# Altium footprint library FS_Footprints.PcbLib: 134 footprints (part 4 of 9)
Each footprint in its own frame and in the unit in brackets; x right, y up, seen from the top. Pads: shape width x height; smd on the part's side, far side on the other; paste and mask are expansions set on the pad; w line width, h text height; cw(c..) or ccw(c..) is an arc to the next point about the centre after c.
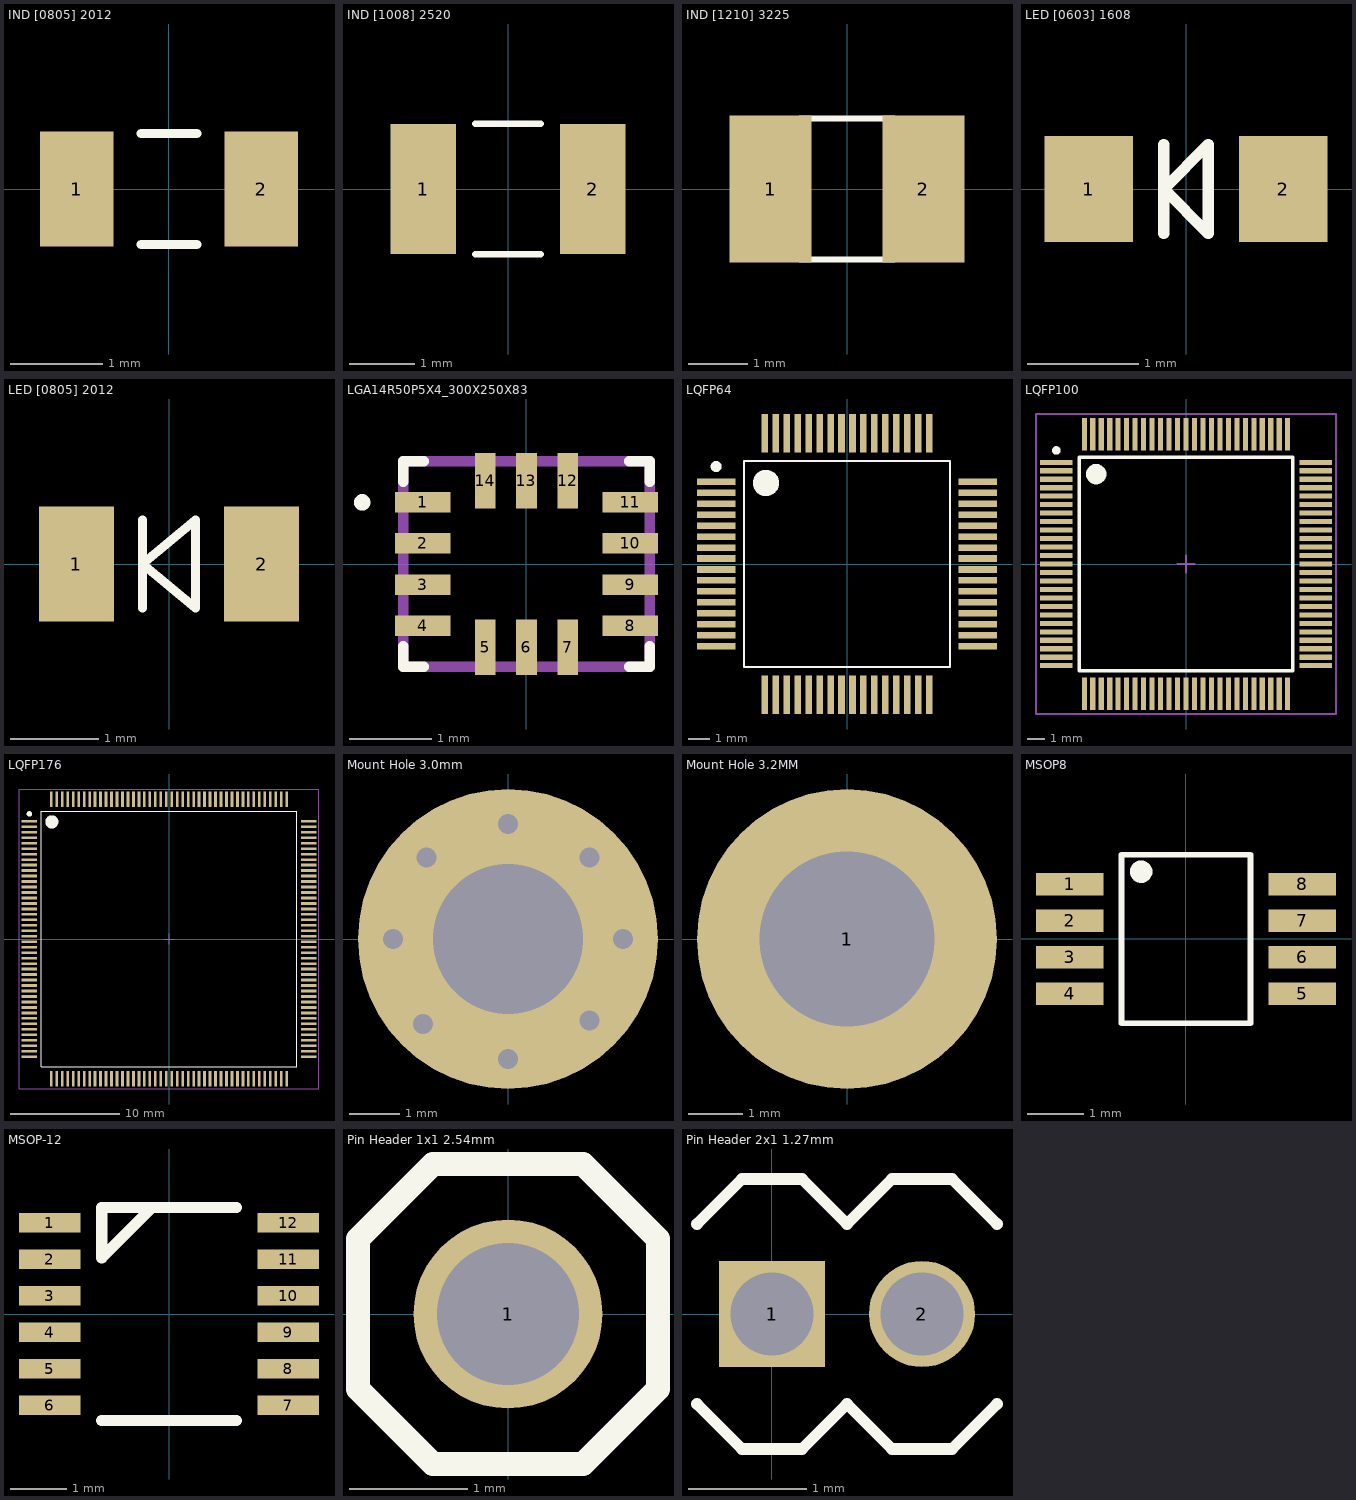
[diagram p3: the footprints below, top view; thin cyan lines are the x and y axes]

## IND [0805] 2012 [mm]
pads (2):
  rect 0.8x1.25 smd: 1(-1,0) 2(1,0)
Top Overlay:
  lines w0.1: -0.3,-0.6 0.3,-0.6 ; -0.3,0.6 0.3,0.6
3D body "Coilcraft-0805HS.step": height 1.44, standoff -0.01, extent -1.09,-0.759 1.09,0.759

## IND [1008] 2520 [mm]
pads (2):
  rect 1x2 smd: 1(-1.3,0) 2(1.3,0)
Top Overlay:
  lines w0.1: -0.5,-1 0.5,-1 ; -0.5,1 0.5,1
3D body "User Library-Chip Inductor 1008.step": height 2, standoff 0, extent -1.25,-1.1 1.25,1.1

## IND [1210] 3225 [mm]
pads (2):
  rect 1.4x2.5 smd: 1(-1.3,0) 2(1.3,0)
Top Overlay:
  lines w0.1: -0.8,-1.2 0.8,-1.2 ; -0.8,1.2 0.8,1.2
3D body "User Library-LQH32CN.step": height 2, standoff 0, extent -1.601,-1.36 1.601,1.361

## LED [0603] 1608 [mm] "Chip Diode, 2-Leads, Body 1.60x0.80mm, IPC Medium Density"
height 0.36
pads (2):
  rect 0.8x0.95 smd: 1(-0.875,0) 2(0.875,0)
Top Overlay:
  lines w0.1: -0.2,-0.4 -0.2,0.4 ; -0.2,0 0.2,-0.4 0.2,0.4 -0.2,0
3D body "User Library-LTST-C190EKT.STEP": height 0.9, standoff 0, extent -0.85,-0.45 0.85,0.45

## LED [0805] 2012 [mm] "0805 Led, 2-Leads, Body 2,00x1,25mm, IPC Medium Density"
height 0.6
pads (2):
  rect 0.85x1.3 smd: 1(-1.05,0) 2(1.05,0)
Top Overlay:
  lines w0.1: -0.3,-0.5 -0.3,0.5 ; -0.3,0 0.3,0.5 0.3,-0.5 -0.3,0
3D body "User Library-LED SMD0805.step": height 0.85, standoff 0.01, extent -1.041,-0.447 1.022,0.46
3D body: height 0.6, standoff 0, extent -1,-0.625 -0.6,0.625
3D body: height 0.6, standoff 0, extent 0.6,-0.625 1,0.625

## LGA14R50P5X4_300X250X83 [mm]
pads (14):
  rect 0.675x0.25 smd: 1(-1.262,0.75) 2(-1.262,0.25) 3(-1.262,-0.25) 4(-1.262,-0.75) 8(1.262,-0.75) 9(1.262,-0.25) 10(1.262,0.25) 11(1.262,0.75)
  rect 0.25x0.675 smd: 5(-0.5,-1.012) 6(0,-1.012) 7(0.5,-1.012) 12(0.5,1.012) 13(0,1.012) 14(-0.5,1.012)
Top Overlay:
  circle w0.1: c-2,0.75 r0.05
  lines w0.127: -1.5,-1 -1.5,-1.25 -1.25,-1.25 ; -1.5,1 -1.5,1.25 -1.25,1.25 ; 1.25,-1.25 1.5,-1.25 1.5,-1 ; 1.25,1.25 1.5,1.25 1.5,1
Top Paste:
  region: -1.6,0.625 -0.925,0.625 -0.925,0.875 -1.6,0.875
  region: -1.6,0.125 -0.925,0.125 -0.925,0.375 -1.6,0.375
  region: -1.6,-0.375 -0.925,-0.375 -0.925,-0.125 -1.6,-0.125
  region: -1.6,-0.875 -0.925,-0.875 -0.925,-0.625 -1.6,-0.625
  region: -0.625,-0.675 -0.625,-1.35 -0.375,-1.35 -0.375,-0.675
  region: -0.125,-0.675 -0.125,-1.35 0.125,-1.35 0.125,-0.675
  region: 0.375,-0.675 0.375,-1.35 0.625,-1.35 0.625,-0.675
  region: 0.925,-0.875 1.6,-0.875 1.6,-0.625 0.925,-0.625
  region: 0.925,-0.375 1.6,-0.375 1.6,-0.125 0.925,-0.125
  region: 0.925,0.125 1.6,0.125 1.6,0.375 0.925,0.375
  region: 0.625,0.675 0.625,1.35 0.375,1.35 0.375,0.675
  region: 0.125,0.675 0.125,1.35 -0.125,1.35 -0.125,0.675
  region: -0.375,0.675 -0.375,1.35 -0.625,1.35 -0.625,0.675
Mechanical 1:
  lines w0.127: -1.5,-1.25 1.5,-1.25 1.5,1.25 -1.5,1.25 -1.5,-1.25

## LQFP64 [mm]
height 1.6
pads (64):
  rect 1.75x0.3 smd: 1(-5.975,3.75) 2(-5.975,3.25) 3(-5.975,2.75) 4(-5.975,2.25) 5(-5.975,1.75) 6(-5.975,1.25) 7(-5.975,0.75) 8(-5.975,0.25) 9(-5.975,-0.25) 10(-5.975,-0.75) 11(-5.975,-1.25) 12(-5.975,-1.75) 13(-5.975,-2.25) 14(-5.975,-2.75) 15(-5.975,-3.25) 16(-5.975,-3.75) 33(5.975,-3.75) 34(5.975,-3.25) 35(5.975,-2.75) 36(5.975,-2.25) 37(5.975,-1.75) 38(5.975,-1.25) 39(5.975,-0.75) 40(5.975,-0.25) 41(5.975,0.25) 42(5.975,0.75) 43(5.975,1.25) 44(5.975,1.75) 45(5.975,2.25) 46(5.975,2.75) 47(5.975,3.25) 48(5.975,3.75)
  rect 0.3x1.75 smd: 17(-3.75,-5.975) 18(-3.25,-5.975) 19(-2.75,-5.975) 20(-2.25,-5.975) 21(-1.75,-5.975) 22(-1.25,-5.975) 23(-0.75,-5.975) 24(-0.25,-5.975) 25(0.25,-5.975) 26(0.75,-5.975) 27(1.25,-5.975) 28(1.75,-5.975) 29(2.25,-5.975) 30(2.75,-5.975) 31(3.25,-5.975) 32(3.75,-5.975) 49(3.75,5.975) 50(3.25,5.975) 51(2.75,5.975) 52(2.25,5.975) 53(1.75,5.975) 54(1.25,5.975) 55(0.75,5.975) 56(0.25,5.975) 57(-0.25,5.975) 58(-0.75,5.975) 59(-1.25,5.975) 60(-1.75,5.975) 61(-2.25,5.975) 62(-2.75,5.975) 63(-3.25,5.975) 64(-3.75,5.975)
Top Overlay:
  circle w0.6: c-3.7,3.7 r0.3
  circle w0.25: c-5.975,4.45 r0.125
  lines w0.1: -4.7,-4.7 4.7,-4.7 4.7,4.7 -4.7,4.7 -4.7,-4.7
3D body "User Library-lqpf64.step": height 1.5, standoff 0.02, extent -6,-6 6,6

## LQFP100 [mm] "LQFP, 100-Leads, Body 16,2x16,2mm (max), Pitch 0,50mm, IPC Medium Density"
height 1.6
pads (100):
  rect 1.9x0.3 smd: 1(-7.65,6) 2(-7.65,5.5) 3(-7.65,5) 4(-7.65,4.5) 5(-7.65,4) 6(-7.65,3.5) 7(-7.65,3) 8(-7.65,2.5) 9(-7.65,2) 10(-7.65,1.5) 11(-7.65,1) 12(-7.65,0.5) 13(-7.65,0) 14(-7.65,-0.5) 15(-7.65,-1) 16(-7.65,-1.5) 17(-7.65,-2) 18(-7.65,-2.5) 19(-7.65,-3) 20(-7.65,-3.5) 21(-7.65,-4) 22(-7.65,-4.5) 23(-7.65,-5) 24(-7.65,-5.5) 25(-7.65,-6) 51(7.65,-6) 52(7.65,-5.5) 53(7.65,-5) 54(7.65,-4.5) 55(7.65,-4) 56(7.65,-3.5) 57(7.65,-3) 58(7.65,-2.5) 59(7.65,-2) 60(7.65,-1.5) 61(7.65,-1) 62(7.65,-0.5) 63(7.65,0) 64(7.65,0.5) 65(7.65,1) 66(7.65,1.5) 67(7.65,2) 68(7.65,2.5) 69(7.65,3) 70(7.65,3.5) 71(7.65,4) 72(7.65,4.5) 73(7.65,5) 74(7.65,5.5) 75(7.65,6)
  rect 0.3x1.9 smd: 26(-6,-7.65) 27(-5.5,-7.65) 28(-5,-7.65) 29(-4.5,-7.65) 30(-4,-7.65) 31(-3.5,-7.65) 32(-3,-7.65) 33(-2.5,-7.65) 34(-2,-7.65) 35(-1.5,-7.65) 36(-1,-7.65) 37(-0.5,-7.65) 38(0,-7.65) 39(0.5,-7.65) 40(1,-7.65) 41(1.5,-7.65) 42(2,-7.65) 43(2.5,-7.65) 44(3,-7.65) 45(3.5,-7.65) 46(4,-7.65) 47(4.5,-7.65) 48(5,-7.65) 49(5.5,-7.65) 50(6,-7.65) 76(6,7.65) 77(5.5,7.65) 78(5,7.65) 79(4.5,7.65) 80(4,7.65) 81(3.5,7.65) 82(3,7.65) 83(2.5,7.65) 84(2,7.65) 85(1.5,7.65) 86(1,7.65) 87(0.5,7.65) 88(0,7.65) 89(-0.5,7.65) 90(-1,7.65) 91(-1.5,7.65) 92(-2,7.65) 93(-2.5,7.65) 94(-3,7.65) 95(-3.5,7.65) 96(-4,7.65) 97(-4.5,7.65) 98(-5,7.65) 99(-5.5,7.65) 100(-6,7.65)
Top Overlay:
  circle w0.6: c-5.3,5.3 r0.3
  circle w0.25: c-7.65,6.7 r0.125
  lines w0.2: -6.3,-6.3 6.3,-6.3 6.3,6.3 -6.3,6.3 -6.3,-6.3
Mechanical 15:
  lines w0.1: -0.5,0 0.5,0 ; 0,-0.5 0,0.5 ; -8.85,-8.85 8.85,-8.85 8.85,8.85 -8.85,8.85 -8.85,-8.85
3D body "User Library-LQFP100.step": height 1.6, standoff 0, extent -8,-8 8,8

## LQFP176 [mm]
height 1.6
pads (176):
  rect 1.4x0.25 smd: 1(-12.75,10.75) 2(-12.75,10.25) 3(-12.75,9.75) 4(-12.75,9.25) 5(-12.75,8.75) 6(-12.75,8.25) 7(-12.75,7.75) 8(-12.75,7.25) 9(-12.75,6.75) 10(-12.75,6.25) 11(-12.75,5.75) 12(-12.75,5.25) 13(-12.75,4.75) 14(-12.75,4.25) 15(-12.75,3.75) 16(-12.75,3.25) 17(-12.75,2.75) 18(-12.75,2.25) 19(-12.75,1.75) 20(-12.75,1.25) 21(-12.75,0.75) 22(-12.75,0.25) 23(-12.75,-0.25) 24(-12.75,-0.75) 25(-12.75,-1.25) 26(-12.75,-1.75) 27(-12.75,-2.25) 28(-12.75,-2.75) 29(-12.75,-3.25) 30(-12.75,-3.75) 31(-12.75,-4.25) 32(-12.75,-4.75) 33(-12.75,-5.25) 34(-12.75,-5.75) 35(-12.75,-6.25) 36(-12.75,-6.75) 37(-12.75,-7.25) 38(-12.75,-7.75) 39(-12.75,-8.25) 40(-12.75,-8.75) 41(-12.75,-9.25) 42(-12.75,-9.75) 43(-12.75,-10.25) 44(-12.75,-10.75) 89(12.75,-10.75) 90(12.75,-10.25) 91(12.75,-9.75) 92(12.75,-9.25) 93(12.75,-8.75) 94(12.75,-8.25) 95(12.75,-7.75) 96(12.75,-7.25) 97(12.75,-6.75) 98(12.75,-6.25) 99(12.75,-5.75) 100(12.75,-5.25) 101(12.75,-4.75) 102(12.75,-4.25) 103(12.75,-3.75) 104(12.75,-3.25) 105(12.75,-2.75) 106(12.75,-2.25) 107(12.75,-1.75) 108(12.75,-1.25) 109(12.75,-0.75) 110(12.75,-0.25) 111(12.75,0.25) 112(12.75,0.75) 113(12.75,1.25) 114(12.75,1.75) 115(12.75,2.25) 116(12.75,2.75) 117(12.75,3.25) 118(12.75,3.75) 119(12.75,4.25) 120(12.75,4.75) 121(12.75,5.25) 122(12.75,5.75) 123(12.75,6.25) 124(12.75,6.75) 125(12.75,7.25) 126(12.75,7.75) 127(12.75,8.25) 128(12.75,8.75) 129(12.75,9.25) 130(12.75,9.75) 131(12.75,10.25) 132(12.75,10.75)
  rect 0.25x1.4 smd: 45(-10.75,-12.75) 46(-10.25,-12.75) 47(-9.75,-12.75) 48(-9.25,-12.75) 49(-8.75,-12.75) 50(-8.25,-12.75) 51(-7.75,-12.75) 52(-7.25,-12.75) 53(-6.75,-12.75) 54(-6.25,-12.75) 55(-5.75,-12.75) 56(-5.25,-12.75) 57(-4.75,-12.75) 58(-4.25,-12.75) 59(-3.75,-12.75) 60(-3.25,-12.75) 61(-2.75,-12.75) 62(-2.25,-12.75) 63(-1.75,-12.75) 64(-1.25,-12.75) 65(-0.75,-12.75) 66(-0.25,-12.75) 67(0.25,-12.75) 68(0.75,-12.75) 69(1.25,-12.75) 70(1.75,-12.75) 71(2.25,-12.75) 72(2.75,-12.75) 73(3.25,-12.75) 74(3.75,-12.75) 75(4.25,-12.75) 76(4.75,-12.75) 77(5.25,-12.75) 78(5.75,-12.75) 79(6.25,-12.75) 80(6.75,-12.75) 81(7.25,-12.75) 82(7.75,-12.75) 83(8.25,-12.75) 84(8.75,-12.75) 85(9.25,-12.75) 86(9.75,-12.75) 87(10.25,-12.75) 88(10.75,-12.75) 133(10.75,12.75) 134(10.25,12.75) 135(9.75,12.75) 136(9.25,12.75) 137(8.75,12.75) 138(8.25,12.75) 139(7.75,12.75) 140(7.25,12.75) 141(6.75,12.75) 142(6.25,12.75) 143(5.75,12.75) 144(5.25,12.75) 145(4.75,12.75) 146(4.25,12.75) 147(3.75,12.75) 148(3.25,12.75) 149(2.75,12.75) 150(2.25,12.75) 151(1.75,12.75) 152(1.25,12.75) 153(0.75,12.75) 154(0.25,12.75) 155(-0.25,12.75) 156(-0.75,12.75) 157(-1.25,12.75) 158(-1.75,12.75) 159(-2.25,12.75) 160(-2.75,12.75) 161(-3.25,12.75) 162(-3.75,12.75) 163(-4.25,12.75) 164(-4.75,12.75) 165(-5.25,12.75) 166(-5.75,12.75) 167(-6.25,12.75) 168(-6.75,12.75) 169(-7.25,12.75) 170(-7.75,12.75) 171(-8.25,12.75) 172(-8.75,12.75) 173(-9.25,12.75) 174(-9.75,12.75) 175(-10.25,12.75) 176(-10.75,12.75)
Top Overlay:
  circle w0.6: c-10.7,10.7 r0.3
  circle w0.25: c-12.75,11.425 r0.125
  lines w0.1: -11.65,-11.65 11.65,-11.65 11.65,11.65 -11.65,11.65 -11.65,-11.65
Mechanical 15:
  lines w0.05: -13.7,-13.7 13.7,-13.7 13.7,13.7 -13.7,13.7 -13.7,-13.7
  lines w0.1: -0.5,0 0.5,0 ; 0,-0.5 0,0.5
3D body "User Library-LQFP176.step": height 1.7, standoff 0, extent -13.01,-13.021 13.01,13

## Mount Hole 2.2mm [mm]
via 0,0 diameter 4 hole 2.2

## Mount Hole 3.0mm [mm] "3mm inner diameter, 6mm outer"
pads (1):
  round 6 hole 3: ""(0,0)
via 0,2.3 diameter 0.8 hole 0.4
via 0,-2.4 diameter 0.8 hole 0.4
via -2.3,0 diameter 0.8 hole 0.4
via 2.3,0 diameter 0.8 hole 0.4
via 1.626,-1.626 diameter 0.8 hole 0.4
via -1.626,1.626 diameter 0.8 hole 0.4
via -1.697,-1.697 diameter 0.8 hole 0.4
via 1.626,1.626 diameter 0.8 hole 0.4

## Mount Hole 3.2MM [mm]
pads (1):
  round 5.5 hole 3.2: 1(0,0)

## MSOP8 [mm] "Mini SOIC, 8-Leads, Body 3.20x3.10mm, Pitch 0.65mm, IPC Medium Density"
height 1.2
pads (8):
  rect 1.2x0.4 smd: 1(-2.075,0.975) 2(-2.075,0.325) 3(-2.075,-0.325) 4(-2.075,-0.975) 5(2.075,-0.975) 6(2.075,-0.325) 7(2.075,0.325) 8(2.075,0.975)
Top Overlay:
  circle w0.2: c-0.8,1.2 r0.1
  lines w0.1: -1.15,-1.5 -1.15,1.5 1.15,1.5 1.15,-1.5 -1.15,-1.5
3D body "User Library-User Library-MSOP-8-1.step": height 0.92, standoff 0, extent -2.5,-1.5 2.5,1.5

## MSOP-12 [mm]
height 2.65
pads (12):
  rect 1.1x0.35 smd: 1(-2.125,1.625) 2(-2.125,0.975) 3(-2.125,0.325) 4(-2.125,-0.325) 5(-2.125,-0.975) 6(-2.125,-1.625) 7(2.125,-1.625) 8(2.125,-0.975) 9(2.125,-0.325) 10(2.125,0.325) 11(2.125,0.975) 12(2.125,1.625)
Top Overlay:
  lines w0.2: -1.2,-1.9 1.2,-1.9 ; -0.3,1.9 -1.2,1 -1.2,1.9 1.2,1.9
3D body "User Library-msop-12.step": height 1.1, standoff 0, extent -2.45,-2.02 2.45,2.02

## Pin Header 1x1 2.54mm [mm]
pads (1):
  round 1.6 hole 1.2: 1(0,0)
Top Overlay:
  lines w0.2: -1.27,-0.635 -1.27,0.635 -0.635,1.27 0.635,1.27 1.27,0.635 1.27,-0.635 0.635,-1.27 -0.635,-1.27 -1.27,-0.635
3D body "User Library-Header_Male_1Pin.STEP": height 8.54, standoff -3, extent -1.27,-1.245 1.27,1.245

## Pin Header 2x1 1.27mm [mm]
pads (2):
  rect 0.9x0.9 hole 0.7: 1(0,0)
  round 0.9 hole 0.7: 2(1.27,0)
Top Overlay:
  lines w0.1: -0.635,-0.762 -0.254,-1.143 0.254,-1.143 0.635,-0.762 1.016,-1.143 1.524,-1.143 1.905,-0.762 ; -0.635,0.762 -0.254,1.143 0.254,1.143 0.635,0.762 1.016,1.143 1.524,1.143 1.905,0.762
3D body: height 5.8, standoff -2.3, extent 1.07,-0.2 1.47,0.2
3D body: height 2.54, standoff 0, extent 0.635,-1.27 1.905,1.27
3D body: height 2.54, standoff 0, extent -0.635,-1.27 0.635,1.27
3D body: height 5.8, standoff -2.3, extent -0.2,-0.2 0.2,0.2